# Altium schematic symbol library jlcpcb_2025_04_resistors_extended_2512.schlib: 2667 symbols (part 10 of 14)
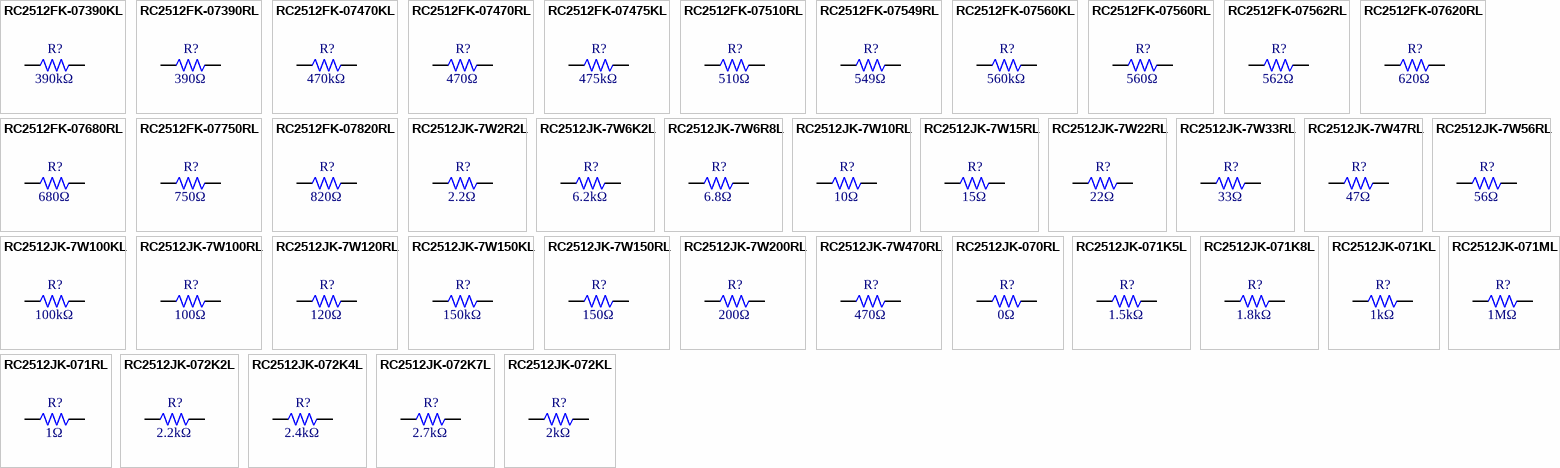
[diagram p75: symbols RC2512FK-07390KL to RC2512JK-072KL]

## RC2512JK-7W120RL
designator R?  Resistance: 120Ω  (hidden comment: *)
Resistor, 120Ω, ±5%, 2W, 200V, -55℃~+155℃, SMD 2512; Manufacturer: Uniroyal; Manufacturer Part Number: RC2512JK-7W120RL; Supplier 1: LCSC; Supplier Part Number 1: C2980091; JLCPCB Part Number: C2980091; Power Rating: 2W; Category: Resistors; Package Size: 2512; JLCPCB Basic Part: Yes; Tolerance: ±5%; Voltage Rating: 200V; Temperature Rating: -55℃~+155℃; ComponentLink1Description: Datasheet; ComponentLink1URL: https://wmsc.lcsc.com/wmsc/upload/file/pdf/v2/lcsc/2203031730_YAGEO-RC2512JK-7W120RL_C2980091.pdf; ComponentLink2Description: JLCPCB Part URL; ComponentLink2URL: https://jlcpcb.com/partdetail/C2980091
pins: 1, 2
1 alternate drawing of the same symbol

## RC2512JK-7W150KL
designator R?  Resistance: 150kΩ  (hidden comment: *)
Resistor, 150kΩ, ±5%, 2W, 200V, ±200ppm/℃, -55℃~+155℃, SMD 2512; Manufacturer: Uniroyal; Manufacturer Part Number: RC2512JK-7W150KL; Supplier 1: LCSC; Supplier Part Number 1: C723724; JLCPCB Part Number: C723724; Power Rating: 2W; Category: Resistors; Package Size: 2512; JLCPCB Basic Part: Yes; Tolerance: ±5%; Voltage Rating: 200V; Temperature Coefficient: ±200ppm/℃; Temperature Rating: -55℃~+155℃; ComponentLink1Description: Datasheet; ComponentLink1URL: https://wmsc.lcsc.com/wmsc/upload/file/pdf/v2/lcsc/2008171337_YAGEO-RC2512JK-7W150KL_C723724.pdf; ComponentLink2Description: JLCPCB Part URL; ComponentLink2URL: https://jlcpcb.com/partdetail/C723724
pins: 1, 2
1 alternate drawing of the same symbol

## RC2512JK-7W150RL
designator R?  Resistance: 150Ω  (hidden comment: *)
Resistor, 150Ω, ±5%, 2W, 200V, ±200ppm/℃, -55℃~+155℃, SMD 2512; Manufacturer: Uniroyal; Manufacturer Part Number: RC2512JK-7W150RL; Supplier 1: LCSC; Supplier Part Number 1: C876266; JLCPCB Part Number: C876266; Power Rating: 2W; Category: Resistors; Package Size: 2512; JLCPCB Basic Part: Yes; Tolerance: ±5%; Voltage Rating: 200V; Temperature Coefficient: ±200ppm/℃; Temperature Rating: -55℃~+155℃; ComponentLink1Description: Datasheet; ComponentLink1URL: https://wmsc.lcsc.com/wmsc/upload/file/pdf/v2/lcsc/2112131830_YAGEO-RC2512JK-7W150RL_C876266.pdf; ComponentLink2Description: JLCPCB Part URL; ComponentLink2URL: https://jlcpcb.com/partdetail/C876266
pins: 1, 2
1 alternate drawing of the same symbol

## RC2512JK-7W200RL
designator R?  Resistance: 200Ω  (hidden comment: *)
Resistor, 200Ω, ±5%, 2W, ±200ppm/℃, -55℃~+155℃, SMD 2512; Manufacturer: Uniroyal; Manufacturer Part Number: RC2512JK-7W200RL; Supplier 1: LCSC; Supplier Part Number 1: C5441843; JLCPCB Part Number: C5441843; Power Rating: 2W; Category: Resistors; Package Size: 2512; JLCPCB Basic Part: Yes; Tolerance: ±5%; Temperature Coefficient: ±200ppm/℃; Temperature Rating: -55℃~+155℃; ComponentLink1Description: Datasheet; ComponentLink1URL: https://wmsc.lcsc.com/wmsc/upload/file/pdf/v2/lcsc/2304071000_YAGEO-RC2512JK-7W200RL_C5441843.pdf; ComponentLink2Description: JLCPCB Part URL; ComponentLink2URL: https://jlcpcb.com/partdetail/C5441843
pins: 1, 2
1 alternate drawing of the same symbol

## RC2512JK-7W470RL
designator R?  Resistance: 470Ω  (hidden comment: *)
Resistor, 470Ω, ±5%, 2W, 200V, ±200ppm/℃, -55℃~+155℃, SMD 2512; Manufacturer: Uniroyal; Manufacturer Part Number: RC2512JK-7W470RL; Supplier 1: LCSC; Supplier Part Number 1: C136993; JLCPCB Part Number: C136993; Power Rating: 2W; Category: Resistors; Package Size: 2512; JLCPCB Basic Part: Yes; Tolerance: ±5%; Voltage Rating: 200V; Temperature Coefficient: ±200ppm/℃; Temperature Rating: -55℃~+155℃; ComponentLink1Description: Datasheet; ComponentLink1URL: https://wmsc.lcsc.com/wmsc/upload/file/pdf/v2/lcsc/2304140030_YAGEO-RC2512JK-7W470RL_C136993.pdf; ComponentLink2Description: JLCPCB Part URL; ComponentLink2URL: https://jlcpcb.com/partdetail/C136993
pins: 1, 2
1 alternate drawing of the same symbol

## RC2512JK-070RL
designator R?  Resistance: 0Ω  (hidden comment: *)
Resistor, 0Ω, 1W, 200V, -55℃~+155℃, SMD 2512; Manufacturer: Uniroyal; Manufacturer Part Number: RC2512JK-070RL; Supplier 1: LCSC; Supplier Part Number 1: C189505; JLCPCB Part Number: C189505; Power Rating: 1W; Category: Resistors; Package Size: 2512; JLCPCB Basic Part: Yes; Voltage Rating: 200V; Temperature Rating: -55℃~+155℃; ComponentLink1Description: Datasheet; ComponentLink1URL: https://wmsc.lcsc.com/wmsc/upload/file/pdf/v2/lcsc/2304140030_YAGEO-RC2512JK-070RL_C189505.pdf; ComponentLink2Description: JLCPCB Part URL; ComponentLink2URL: https://jlcpcb.com/partdetail/C189505
pins: 1, 2
1 alternate drawing of the same symbol

## RC2512JK-071K5L
designator R?  Resistance: 1.5kΩ  (hidden comment: *)
Resistor, 1.5kΩ, ±5%, 1W, 200V, ±100ppm/℃, -55℃~+155℃, SMD 2512; Manufacturer: Uniroyal; Manufacturer Part Number: RC2512JK-071K5L; Supplier 1: LCSC; Supplier Part Number 1: C309611; JLCPCB Part Number: C309611; Power Rating: 1W; Category: Resistors; Package Size: 2512; JLCPCB Basic Part: Yes; Tolerance: ±5%; Voltage Rating: 200V; Temperature Coefficient: ±100ppm/℃; Temperature Rating: -55℃~+155℃; ComponentLink1Description: Datasheet; ComponentLink1URL: https://wmsc.lcsc.com/wmsc/upload/file/pdf/v2/lcsc/2304140030_YAGEO-RC2512JK-071K5L_C309611.pdf; ComponentLink2Description: JLCPCB Part URL; ComponentLink2URL: https://jlcpcb.com/partdetail/C309611
pins: 1, 2
1 alternate drawing of the same symbol

## RC2512JK-071K8L
designator R?  Resistance: 1.8kΩ  (hidden comment: *)
Resistor, 1.8kΩ, ±5%, 1W, 200V, ±100ppm/℃, -55℃~+155℃, SMD 2512; Manufacturer: Uniroyal; Manufacturer Part Number: RC2512JK-071K8L; Supplier 1: LCSC; Supplier Part Number 1: C137011; JLCPCB Part Number: C137011; Power Rating: 1W; Category: Resistors; Package Size: 2512; JLCPCB Basic Part: Yes; Tolerance: ±5%; Voltage Rating: 200V; Temperature Coefficient: ±100ppm/℃; Temperature Rating: -55℃~+155℃; ComponentLink1Description: Datasheet; ComponentLink1URL: https://wmsc.lcsc.com/wmsc/upload/file/pdf/v2/lcsc/2304140030_YAGEO-RC2512JK-071K8L_C137011.pdf; ComponentLink2Description: JLCPCB Part URL; ComponentLink2URL: https://jlcpcb.com/partdetail/C137011
pins: 1, 2
1 alternate drawing of the same symbol

## RC2512JK-071KL
designator R?  Resistance: 1kΩ  (hidden comment: *)
Resistor, 1kΩ, ±5%, 1W, 200V, ±100ppm/℃, -55℃~+155℃, SMD 2512; Manufacturer: Uniroyal; Manufacturer Part Number: RC2512JK-071KL; Supplier 1: LCSC; Supplier Part Number 1: C137010; JLCPCB Part Number: C137010; Power Rating: 1W; Category: Resistors; Package Size: 2512; JLCPCB Basic Part: Yes; Tolerance: ±5%; Voltage Rating: 200V; Temperature Coefficient: ±100ppm/℃; Temperature Rating: -55℃~+155℃; ComponentLink1Description: Datasheet; ComponentLink1URL: https://wmsc.lcsc.com/wmsc/upload/file/pdf/v2/lcsc/2304140030_YAGEO-RC2512JK-071KL_C137010.pdf; ComponentLink2Description: JLCPCB Part URL; ComponentLink2URL: https://jlcpcb.com/partdetail/C137010
pins: 1, 2
1 alternate drawing of the same symbol

## RC2512JK-071ML
designator R?  Resistance: 1MΩ  (hidden comment: *)
Resistor, 1MΩ, ±5%, 1W, 200V, ±100ppm/℃, -55℃~+155℃, SMD 2512; Manufacturer: Uniroyal; Manufacturer Part Number: RC2512JK-071ML; Supplier 1: LCSC; Supplier Part Number 1: C723725; JLCPCB Part Number: C723725; Power Rating: 1W; Category: Resistors; Package Size: 2512; JLCPCB Basic Part: Yes; Tolerance: ±5%; Voltage Rating: 200V; Temperature Coefficient: ±100ppm/℃; Temperature Rating: -55℃~+155℃; ComponentLink1Description: Datasheet; ComponentLink1URL: https://wmsc.lcsc.com/wmsc/upload/file/pdf/v2/lcsc/2008201237_YAGEO-RC2512JK-071ML_C723725.pdf; ComponentLink2Description: JLCPCB Part URL; ComponentLink2URL: https://jlcpcb.com/partdetail/C723725
pins: 1, 2
1 alternate drawing of the same symbol

## RC2512JK-071RL
designator R?  Resistance: 1Ω  (hidden comment: *)
Resistor, 1Ω, ±5%, 1W, 200V, ±200ppm/℃, -55℃~+155℃, SMD 2512; Manufacturer: Uniroyal; Manufacturer Part Number: RC2512JK-071RL; Supplier 1: LCSC; Supplier Part Number 1: C914852; JLCPCB Part Number: C914852; Power Rating: 1W; Category: Resistors; Package Size: 2512; JLCPCB Basic Part: Yes; Tolerance: ±5%; Voltage Rating: 200V; Temperature Coefficient: ±200ppm/℃; Temperature Rating: -55℃~+155℃; ComponentLink1Description: Datasheet; ComponentLink1URL: https://wmsc.lcsc.com/wmsc/upload/file/pdf/v2/lcsc/2204291430_YAGEO-RC2512JK-071RL_C914852.pdf; ComponentLink2Description: JLCPCB Part URL; ComponentLink2URL: https://jlcpcb.com/partdetail/C914852
pins: 1, 2
1 alternate drawing of the same symbol

## RC2512JK-072K2L
designator R?  Resistance: 2.2kΩ  (hidden comment: *)
Resistor, 2.2kΩ, ±5%, 1W, 200V, ±100ppm/℃, -55℃~+155℃, SMD 2512; Manufacturer: Uniroyal; Manufacturer Part Number: RC2512JK-072K2L; Supplier 1: LCSC; Supplier Part Number 1: C309612; JLCPCB Part Number: C309612; Power Rating: 1W; Category: Resistors; Package Size: 2512; JLCPCB Basic Part: Yes; Tolerance: ±5%; Voltage Rating: 200V; Temperature Coefficient: ±100ppm/℃; Temperature Rating: -55℃~+155℃; ComponentLink1Description: Datasheet; ComponentLink1URL: https://wmsc.lcsc.com/wmsc/upload/file/pdf/v2/lcsc/2304140030_YAGEO-RC2512JK-072K2L_C309612.pdf; ComponentLink2Description: JLCPCB Part URL; ComponentLink2URL: https://jlcpcb.com/partdetail/C309612
pins: 1, 2
1 alternate drawing of the same symbol

## RC2512JK-072K4L
designator R?  Resistance: 2.4kΩ  (hidden comment: *)
Resistor, 2.4kΩ, ±5%, 1W, ±100ppm/℃, -55℃~+155℃, SMD 2512; Manufacturer: Uniroyal; Manufacturer Part Number: RC2512JK-072K4L; Supplier 1: LCSC; Supplier Part Number 1: C4030553; JLCPCB Part Number: C4030553; Power Rating: 1W; Category: Resistors; Package Size: 2512; JLCPCB Basic Part: Yes; Tolerance: ±5%; Temperature Coefficient: ±100ppm/℃; Temperature Rating: -55℃~+155℃; ComponentLink1Description: Datasheet; ComponentLink1URL: https://wmsc.lcsc.com/wmsc/upload/file/pdf/v2/lcsc/2311211102_YAGEO-RC2512JK-072K4L_C4030553.pdf; ComponentLink2Description: JLCPCB Part URL; ComponentLink2URL: https://jlcpcb.com/partdetail/C4030553
pins: 1, 2
1 alternate drawing of the same symbol

## RC2512JK-072K7L
designator R?  Resistance: 2.7kΩ  (hidden comment: *)
Resistor, 2.7kΩ, ±5%, 1W, 200V, ±100ppm/℃, -55℃~+155℃, SMD 2512; Manufacturer: Uniroyal; Manufacturer Part Number: RC2512JK-072K7L; Supplier 1: LCSC; Supplier Part Number 1: C326685; JLCPCB Part Number: C326685; Power Rating: 1W; Category: Resistors; Package Size: 2512; JLCPCB Basic Part: Yes; Tolerance: ±5%; Voltage Rating: 200V; Temperature Coefficient: ±100ppm/℃; Temperature Rating: -55℃~+155℃; ComponentLink1Description: Datasheet; ComponentLink1URL: https://wmsc.lcsc.com/wmsc/upload/file/pdf/v2/lcsc/1811141450_YAGEO-RC2512JK-072K7L_C326685.pdf; ComponentLink2Description: JLCPCB Part URL; ComponentLink2URL: https://jlcpcb.com/partdetail/C326685
pins: 1, 2
1 alternate drawing of the same symbol

## RC2512JK-072KL
designator R?  Resistance: 2kΩ  (hidden comment: *)
Resistor, 2kΩ, ±5%, 1W, 200V, ±100ppm/℃, -55℃~+155℃, SMD 2512; Manufacturer: Uniroyal; Manufacturer Part Number: RC2512JK-072KL; Supplier 1: LCSC; Supplier Part Number 1: C326688; JLCPCB Part Number: C326688; Power Rating: 1W; Category: Resistors; Package Size: 2512; JLCPCB Basic Part: Yes; Tolerance: ±5%; Voltage Rating: 200V; Temperature Coefficient: ±100ppm/℃; Temperature Rating: -55℃~+155℃; ComponentLink1Description: Datasheet; ComponentLink1URL: https://wmsc.lcsc.com/wmsc/upload/file/pdf/v2/lcsc/1811141444_YAGEO-RC2512JK-072KL_C326688.pdf; ComponentLink2Description: JLCPCB Part URL; ComponentLink2URL: https://jlcpcb.com/partdetail/C326688
pins: 1, 2
1 alternate drawing of the same symbol

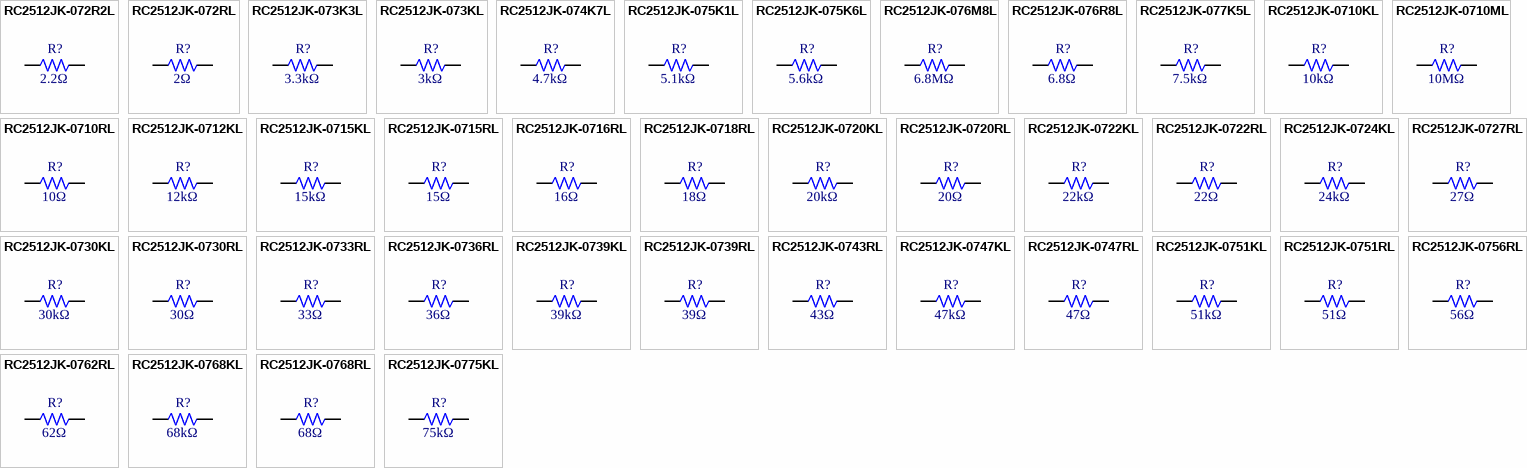
[diagram p45: symbols RC2512JK-072R2L to RC2512JK-0775KL]

## RC2512JK-072R2L
designator R?  Resistance: 2.2Ω  (hidden comment: *)
Resistor, 2.2Ω, ±5%, 1W, 200V, ±200ppm/℃, -55℃~+155℃, SMD 2512; Manufacturer: Uniroyal; Manufacturer Part Number: RC2512JK-072R2L; Supplier 1: LCSC; Supplier Part Number 1: C163332; JLCPCB Part Number: C163332; Power Rating: 1W; Category: Resistors; Package Size: 2512; JLCPCB Basic Part: Yes; Tolerance: ±5%; Voltage Rating: 200V; Temperature Coefficient: ±200ppm/℃; Temperature Rating: -55℃~+155℃; ComponentLink1Description: Datasheet; ComponentLink1URL: https://wmsc.lcsc.com/wmsc/upload/file/pdf/v2/lcsc/2304140030_YAGEO-RC2512JK-072R2L_C163332.pdf; ComponentLink2Description: JLCPCB Part URL; ComponentLink2URL: https://jlcpcb.com/partdetail/C163332
pins: 1, 2
1 alternate drawing of the same symbol

## RC2512JK-072RL
designator R?  Resistance: 2Ω  (hidden comment: *)
Resistor, 2Ω, ±5%, 1W, 200V, ±200ppm/℃, -55℃~+155℃, SMD 2512; Manufacturer: Uniroyal; Manufacturer Part Number: RC2512JK-072RL; Supplier 1: LCSC; Supplier Part Number 1: C137004; JLCPCB Part Number: C137004; Power Rating: 1W; Category: Resistors; Package Size: 2512; JLCPCB Basic Part: Yes; Tolerance: ±5%; Voltage Rating: 200V; Temperature Coefficient: ±200ppm/℃; Temperature Rating: -55℃~+155℃; ComponentLink1Description: Datasheet; ComponentLink1URL: https://wmsc.lcsc.com/wmsc/upload/file/pdf/v2/lcsc/2304140030_YAGEO-RC2512JK-072RL_C137004.pdf; ComponentLink2Description: JLCPCB Part URL; ComponentLink2URL: https://jlcpcb.com/partdetail/C137004
pins: 1, 2
1 alternate drawing of the same symbol

## RC2512JK-073K3L
designator R?  Resistance: 3.3kΩ  (hidden comment: *)
Resistor, 3.3kΩ, ±5%, 1W, 200V, ±100ppm/℃, -55℃~+155℃, SMD 2512; Manufacturer: Uniroyal; Manufacturer Part Number: RC2512JK-073K3L; Supplier 1: LCSC; Supplier Part Number 1: C137001; JLCPCB Part Number: C137001; Power Rating: 1W; Category: Resistors; Package Size: 2512; JLCPCB Basic Part: Yes; Tolerance: ±5%; Voltage Rating: 200V; Temperature Coefficient: ±100ppm/℃; Temperature Rating: -55℃~+155℃; ComponentLink1Description: Datasheet; ComponentLink1URL: https://wmsc.lcsc.com/wmsc/upload/file/pdf/v2/lcsc/2304140030_YAGEO-RC2512JK-073K3L_C137001.pdf; ComponentLink2Description: JLCPCB Part URL; ComponentLink2URL: https://jlcpcb.com/partdetail/C137001
pins: 1, 2
1 alternate drawing of the same symbol

## RC2512JK-073KL
designator R?  Resistance: 3kΩ  (hidden comment: *)
Resistor, 3kΩ, ±5%, 1W, 200V, ±100ppm/℃, -55℃~+155℃, SMD 2512; Manufacturer: Uniroyal; Manufacturer Part Number: RC2512JK-073KL; Supplier 1: LCSC; Supplier Part Number 1: C185255; JLCPCB Part Number: C185255; Power Rating: 1W; Category: Resistors; Package Size: 2512; JLCPCB Basic Part: Yes; Tolerance: ±5%; Voltage Rating: 200V; Temperature Coefficient: ±100ppm/℃; Temperature Rating: -55℃~+155℃; ComponentLink1Description: Datasheet; ComponentLink1URL: https://wmsc.lcsc.com/wmsc/upload/file/pdf/v2/lcsc/1912111437_YAGEO-RC2512JK-073KL_C185255.pdf; ComponentLink2Description: JLCPCB Part URL; ComponentLink2URL: https://jlcpcb.com/partdetail/C185255
pins: 1, 2
1 alternate drawing of the same symbol

## RC2512JK-074K7L
designator R?  Resistance: 4.7kΩ  (hidden comment: *)
Resistor, 4.7kΩ, ±5%, 1W, ±100ppm/℃, -55℃~+155℃, SMD 2512; Manufacturer: Uniroyal; Manufacturer Part Number: RC2512JK-074K7L; Supplier 1: LCSC; Supplier Part Number 1: C878291; JLCPCB Part Number: C878291; Power Rating: 1W; Category: Resistors; Package Size: 2512; JLCPCB Basic Part: Yes; Tolerance: ±5%; Temperature Coefficient: ±100ppm/℃; Temperature Rating: -55℃~+155℃; ComponentLink1Description: Datasheet; ComponentLink1URL: https://wmsc.lcsc.com/wmsc/upload/file/pdf/v2/lcsc/2205121145_YAGEO-RC2512JK-074K7L_C878291.pdf; ComponentLink2Description: JLCPCB Part URL; ComponentLink2URL: https://jlcpcb.com/partdetail/C878291
pins: 1, 2
1 alternate drawing of the same symbol

## RC2512JK-075K1L
designator R?  Resistance: 5.1kΩ  (hidden comment: *)
Resistor, 5.1kΩ, ±5%, 1W, ±100ppm/℃, -55℃~+155℃, SMD 2512; Manufacturer: Uniroyal; Manufacturer Part Number: RC2512JK-075K1L; Supplier 1: LCSC; Supplier Part Number 1: C724018; JLCPCB Part Number: C724018; Power Rating: 1W; Category: Resistors; Package Size: 2512; JLCPCB Basic Part: Yes; Tolerance: ±5%; Temperature Coefficient: ±100ppm/℃; Temperature Rating: -55℃~+155℃; ComponentLink1Description: Datasheet; ComponentLink1URL: https://wmsc.lcsc.com/wmsc/upload/file/pdf/v2/lcsc/2009261810_YAGEO-RC2512JK-075K1L_C724018.pdf; ComponentLink2Description: JLCPCB Part URL; ComponentLink2URL: https://jlcpcb.com/partdetail/C724018
pins: 1, 2
1 alternate drawing of the same symbol

## RC2512JK-075K6L
designator R?  Resistance: 5.6kΩ  (hidden comment: *)
Resistor, 5.6kΩ, ±5%, 1W, 200V, ±100ppm/℃, -55℃~+155℃, SMD 2512; Manufacturer: Uniroyal; Manufacturer Part Number: RC2512JK-075K6L; Supplier 1: LCSC; Supplier Part Number 1: C878298; JLCPCB Part Number: C878298; Power Rating: 1W; Category: Resistors; Package Size: 2512; JLCPCB Basic Part: Yes; Tolerance: ±5%; Voltage Rating: 200V; Temperature Coefficient: ±100ppm/℃; Temperature Rating: -55℃~+155℃; ComponentLink1Description: Datasheet; ComponentLink1URL: https://wmsc.lcsc.com/wmsc/upload/file/pdf/v2/lcsc/2111191730_YAGEO-RC2512JK-075K6L_C878298.pdf; ComponentLink2Description: JLCPCB Part URL; ComponentLink2URL: https://jlcpcb.com/partdetail/C878298
pins: 1, 2
1 alternate drawing of the same symbol

## RC2512JK-076M8L
designator R?  Resistance: 6.8MΩ  (hidden comment: *)
Resistor, 6.8MΩ, ±5%, 1W, 200V, ±100ppm/℃, -55℃~+155℃, SMD 2512; Manufacturer: Uniroyal; Manufacturer Part Number: RC2512JK-076M8L; Supplier 1: LCSC; Supplier Part Number 1: C326687; JLCPCB Part Number: C326687; Power Rating: 1W; Category: Resistors; Package Size: 2512; JLCPCB Basic Part: Yes; Tolerance: ±5%; Voltage Rating: 200V; Temperature Coefficient: ±100ppm/℃; Temperature Rating: -55℃~+155℃; ComponentLink1Description: Datasheet; ComponentLink1URL: https://wmsc.lcsc.com/wmsc/upload/file/pdf/v2/lcsc/1811141444_YAGEO-RC2512JK-076M8L_C326687.pdf; ComponentLink2Description: JLCPCB Part URL; ComponentLink2URL: https://jlcpcb.com/partdetail/C326687
pins: 1, 2
1 alternate drawing of the same symbol

## RC2512JK-076R8L
designator R?  Resistance: 6.8Ω  (hidden comment: *)
Resistor, 6.8Ω, ±5%, 1W, 200V, ±200ppm/℃, -55℃~+155℃, SMD 2512; Manufacturer: Uniroyal; Manufacturer Part Number: RC2512JK-076R8L; Supplier 1: LCSC; Supplier Part Number 1: C326575; JLCPCB Part Number: C326575; Power Rating: 1W; Category: Resistors; Package Size: 2512; JLCPCB Basic Part: Yes; Tolerance: ±5%; Voltage Rating: 200V; Temperature Coefficient: ±200ppm/℃; Temperature Rating: -55℃~+155℃; ComponentLink1Description: Datasheet; ComponentLink1URL: https://wmsc.lcsc.com/wmsc/upload/file/pdf/v2/lcsc/1811141450_YAGEO-RC2512JK-076R8L_C326575.pdf; ComponentLink2Description: JLCPCB Part URL; ComponentLink2URL: https://jlcpcb.com/partdetail/C326575
pins: 1, 2
1 alternate drawing of the same symbol

## RC2512JK-077K5L
designator R?  Resistance: 7.5kΩ  (hidden comment: *)
Resistor, 7.5kΩ, ±5%, 1W, 200V, ±100ppm/℃, -55℃~+155℃, SMD 2512; Manufacturer: Uniroyal; Manufacturer Part Number: RC2512JK-077K5L; Supplier 1: LCSC; Supplier Part Number 1: C136994; JLCPCB Part Number: C136994; Power Rating: 1W; Category: Resistors; Package Size: 2512; JLCPCB Basic Part: Yes; Tolerance: ±5%; Voltage Rating: 200V; Temperature Coefficient: ±100ppm/℃; Temperature Rating: -55℃~+155℃; ComponentLink1Description: Datasheet; ComponentLink1URL: https://wmsc.lcsc.com/wmsc/upload/file/pdf/v2/lcsc/2304140030_YAGEO-RC2512JK-077K5L_C136994.pdf; ComponentLink2Description: JLCPCB Part URL; ComponentLink2URL: https://jlcpcb.com/partdetail/C136994
pins: 1, 2
1 alternate drawing of the same symbol

## RC2512JK-0710KL
designator R?  Resistance: 10kΩ  (hidden comment: *)
Resistor, 10kΩ, ±5%, 1W, 200V, ±100ppm/℃, -55℃~+155℃, SMD 2512; Manufacturer: Uniroyal; Manufacturer Part Number: RC2512JK-0710KL; Supplier 1: LCSC; Supplier Part Number 1: C137016; JLCPCB Part Number: C137016; Power Rating: 1W; Category: Resistors; Package Size: 2512; JLCPCB Basic Part: Yes; Tolerance: ±5%; Voltage Rating: 200V; Temperature Coefficient: ±100ppm/℃; Temperature Rating: -55℃~+155℃; ComponentLink1Description: Datasheet; ComponentLink1URL: https://wmsc.lcsc.com/wmsc/upload/file/pdf/v2/lcsc/2304140030_YAGEO-RC2512JK-0710KL_C137016.pdf; ComponentLink2Description: JLCPCB Part URL; ComponentLink2URL: https://jlcpcb.com/partdetail/C137016
pins: 1, 2
1 alternate drawing of the same symbol

## RC2512JK-0710ML
designator R?  Resistance: 10MΩ  (hidden comment: *)
Resistor, 10MΩ, ±5%, 1W, 200V, ±100ppm/℃, -55℃~+155℃, SMD 2512; Manufacturer: Uniroyal; Manufacturer Part Number: RC2512JK-0710ML; Supplier 1: LCSC; Supplier Part Number 1: C137015; JLCPCB Part Number: C137015; Power Rating: 1W; Category: Resistors; Package Size: 2512; JLCPCB Basic Part: Yes; Tolerance: ±5%; Voltage Rating: 200V; Temperature Coefficient: ±100ppm/℃; Temperature Rating: -55℃~+155℃; ComponentLink1Description: Datasheet; ComponentLink1URL: https://wmsc.lcsc.com/wmsc/upload/file/pdf/v2/lcsc/2304140030_YAGEO-RC2512JK-0710ML_C137015.pdf; ComponentLink2Description: JLCPCB Part URL; ComponentLink2URL: https://jlcpcb.com/partdetail/C137015
pins: 1, 2
1 alternate drawing of the same symbol

## RC2512JK-0710RL
designator R?  Resistance: 10Ω  (hidden comment: *)
Resistor, 10Ω, ±5%, 1W, 200V, ±200ppm/℃, -55℃~+155℃, SMD 2512; Manufacturer: Uniroyal; Manufacturer Part Number: RC2512JK-0710RL; Supplier 1: LCSC; Supplier Part Number 1: C137014; JLCPCB Part Number: C137014; Power Rating: 1W; Category: Resistors; Package Size: 2512; JLCPCB Basic Part: Yes; Tolerance: ±5%; Voltage Rating: 200V; Temperature Coefficient: ±200ppm/℃; Temperature Rating: -55℃~+155℃; ComponentLink1Description: Datasheet; ComponentLink1URL: https://wmsc.lcsc.com/wmsc/upload/file/pdf/v2/lcsc/2304140030_YAGEO-RC2512JK-0710RL_C137014.pdf; ComponentLink2Description: JLCPCB Part URL; ComponentLink2URL: https://jlcpcb.com/partdetail/C137014
pins: 1, 2
1 alternate drawing of the same symbol

## RC2512JK-0712KL
designator R?  Resistance: 12kΩ  (hidden comment: *)
Resistor, 12kΩ, ±5%, 1W, 200V, ±100ppm/℃, -55℃~+155℃, SMD 2512; Manufacturer: Uniroyal; Manufacturer Part Number: RC2512JK-0712KL; Supplier 1: LCSC; Supplier Part Number 1: C724017; JLCPCB Part Number: C724017; Power Rating: 1W; Category: Resistors; Package Size: 2512; JLCPCB Basic Part: Yes; Tolerance: ±5%; Voltage Rating: 200V; Temperature Coefficient: ±100ppm/℃; Temperature Rating: -55℃~+155℃; ComponentLink1Description: Datasheet; ComponentLink1URL: https://wmsc.lcsc.com/wmsc/upload/file/pdf/v2/lcsc/2009261810_YAGEO-RC2512JK-0712KL_C724017.pdf; ComponentLink2Description: JLCPCB Part URL; ComponentLink2URL: https://jlcpcb.com/partdetail/C724017
pins: 1, 2
1 alternate drawing of the same symbol

## RC2512JK-0715KL
designator R?  Resistance: 15kΩ  (hidden comment: *)
Resistor, 15kΩ, ±5%, 1W, 200V, ±100ppm/℃, -55℃~+155℃, SMD 2512; Manufacturer: Uniroyal; Manufacturer Part Number: RC2512JK-0715KL; Supplier 1: LCSC; Supplier Part Number 1: C1882622; JLCPCB Part Number: C1882622; Power Rating: 1W; Category: Resistors; Package Size: 2512; JLCPCB Basic Part: Yes; Tolerance: ±5%; Voltage Rating: 200V; Temperature Coefficient: ±100ppm/℃; Temperature Rating: -55℃~+155℃; ComponentLink1Description: Datasheet; ComponentLink1URL: https://wmsc.lcsc.com/wmsc/upload/file/pdf/v2/lcsc/2201280400_YAGEO-RC2512JK-0715KL_C1882622.pdf; ComponentLink2Description: JLCPCB Part URL; ComponentLink2URL: https://jlcpcb.com/partdetail/C1882622
pins: 1, 2
1 alternate drawing of the same symbol

## RC2512JK-0715RL
designator R?  Resistance: 15Ω  (hidden comment: *)
Resistor, 15Ω, ±5%, 1W, 200V, ±100ppm/℃, -55℃~+155℃, SMD 2512; Manufacturer: Uniroyal; Manufacturer Part Number: RC2512JK-0715RL; Supplier 1: LCSC; Supplier Part Number 1: C326693; JLCPCB Part Number: C326693; Power Rating: 1W; Category: Resistors; Package Size: 2512; JLCPCB Basic Part: Yes; Tolerance: ±5%; Voltage Rating: 200V; Temperature Coefficient: ±100ppm/℃; Temperature Rating: -55℃~+155℃; ComponentLink1Description: Datasheet; ComponentLink1URL: https://wmsc.lcsc.com/wmsc/upload/file/pdf/v2/lcsc/1811141450_YAGEO-RC2512JK-0715RL_C326693.pdf; ComponentLink2Description: JLCPCB Part URL; ComponentLink2URL: https://jlcpcb.com/partdetail/C326693
pins: 1, 2
1 alternate drawing of the same symbol

## RC2512JK-0716RL
designator R?  Resistance: 16Ω  (hidden comment: *)
Resistor, 16Ω, ±5%, 1W, 200V, ±100ppm/℃, -55℃~+155℃, SMD 2512; Manufacturer: Uniroyal; Manufacturer Part Number: RC2512JK-0716RL; Supplier 1: LCSC; Supplier Part Number 1: C326692; JLCPCB Part Number: C326692; Power Rating: 1W; Category: Resistors; Package Size: 2512; JLCPCB Basic Part: Yes; Tolerance: ±5%; Voltage Rating: 200V; Temperature Coefficient: ±100ppm/℃; Temperature Rating: -55℃~+155℃; ComponentLink1Description: Datasheet; ComponentLink1URL: https://wmsc.lcsc.com/wmsc/upload/file/pdf/v2/lcsc/1811141241_YAGEO-RC2512JK-0716RL_C326692.pdf; ComponentLink2Description: JLCPCB Part URL; ComponentLink2URL: https://jlcpcb.com/partdetail/C326692
pins: 1, 2
1 alternate drawing of the same symbol

## RC2512JK-0718RL
designator R?  Resistance: 18Ω  (hidden comment: *)
Resistor, 18Ω, ±5%, 1W, 200V, ±100ppm/℃, -55℃~+155℃, SMD 2512; Manufacturer: Uniroyal; Manufacturer Part Number: RC2512JK-0718RL; Supplier 1: LCSC; Supplier Part Number 1: C326684; JLCPCB Part Number: C326684; Power Rating: 1W; Category: Resistors; Package Size: 2512; JLCPCB Basic Part: Yes; Tolerance: ±5%; Voltage Rating: 200V; Temperature Coefficient: ±100ppm/℃; Temperature Rating: -55℃~+155℃; ComponentLink1Description: Datasheet; ComponentLink1URL: https://wmsc.lcsc.com/wmsc/upload/file/pdf/v2/lcsc/1811141444_YAGEO-RC2512JK-0718RL_C326684.pdf; ComponentLink2Description: JLCPCB Part URL; ComponentLink2URL: https://jlcpcb.com/partdetail/C326684
pins: 1, 2
1 alternate drawing of the same symbol

## RC2512JK-0720KL
designator R?  Resistance: 20kΩ  (hidden comment: *)
Resistor, 20kΩ, ±5%, 1W, 200V, ±100ppm/℃, -55℃~+155℃, SMD 2512; Manufacturer: Uniroyal; Manufacturer Part Number: RC2512JK-0720KL; Supplier 1: LCSC; Supplier Part Number 1: C163333; JLCPCB Part Number: C163333; Power Rating: 1W; Category: Resistors; Package Size: 2512; JLCPCB Basic Part: Yes; Tolerance: ±5%; Voltage Rating: 200V; Temperature Coefficient: ±100ppm/℃; Temperature Rating: -55℃~+155℃; ComponentLink1Description: Datasheet; ComponentLink1URL: https://wmsc.lcsc.com/wmsc/upload/file/pdf/v2/lcsc/2304140030_YAGEO-RC2512JK-0720KL_C163333.pdf; ComponentLink2Description: JLCPCB Part URL; ComponentLink2URL: https://jlcpcb.com/partdetail/C163333
pins: 1, 2
1 alternate drawing of the same symbol

## RC2512JK-0720RL
designator R?  Resistance: 20Ω  (hidden comment: *)
Resistor, 20Ω, ±5%, 1W, 200V, ±100ppm/℃, -55℃~+155℃, SMD 2512; Manufacturer: Uniroyal; Manufacturer Part Number: RC2512JK-0720RL; Supplier 1: LCSC; Supplier Part Number 1: C137009; JLCPCB Part Number: C137009; Power Rating: 1W; Category: Resistors; Package Size: 2512; JLCPCB Basic Part: Yes; Tolerance: ±5%; Voltage Rating: 200V; Temperature Coefficient: ±100ppm/℃; Temperature Rating: -55℃~+155℃; ComponentLink1Description: Datasheet; ComponentLink1URL: https://wmsc.lcsc.com/wmsc/upload/file/pdf/v2/lcsc/2304140030_YAGEO-RC2512JK-0720RL_C137009.pdf; ComponentLink2Description: JLCPCB Part URL; ComponentLink2URL: https://jlcpcb.com/partdetail/C137009
pins: 1, 2
1 alternate drawing of the same symbol

## RC2512JK-0722KL
designator R?  Resistance: 22kΩ  (hidden comment: *)
Resistor, 22kΩ, ±5%, 1W, 200V, ±100ppm/℃, -55℃~+155℃, SMD 2512; Manufacturer: Uniroyal; Manufacturer Part Number: RC2512JK-0722KL; Supplier 1: LCSC; Supplier Part Number 1: C326690; JLCPCB Part Number: C326690; Power Rating: 1W; Category: Resistors; Package Size: 2512; JLCPCB Basic Part: Yes; Tolerance: ±5%; Voltage Rating: 200V; Temperature Coefficient: ±100ppm/℃; Temperature Rating: -55℃~+155℃; ComponentLink1Description: Datasheet; ComponentLink1URL: https://wmsc.lcsc.com/wmsc/upload/file/pdf/v2/lcsc/1811141444_YAGEO-RC2512JK-0722KL_C326690.pdf; ComponentLink2Description: JLCPCB Part URL; ComponentLink2URL: https://jlcpcb.com/partdetail/C326690
pins: 1, 2
1 alternate drawing of the same symbol

## RC2512JK-0722RL
designator R?  Resistance: 22Ω  (hidden comment: *)
Resistor, 22Ω, ±5%, 1W, 200V, ±100ppm/℃, -55℃~+155℃, SMD 2512; Manufacturer: Uniroyal; Manufacturer Part Number: RC2512JK-0722RL; Supplier 1: LCSC; Supplier Part Number 1: C137007; JLCPCB Part Number: C137007; Power Rating: 1W; Category: Resistors; Package Size: 2512; JLCPCB Basic Part: Yes; Tolerance: ±5%; Voltage Rating: 200V; Temperature Coefficient: ±100ppm/℃; Temperature Rating: -55℃~+155℃; ComponentLink1Description: Datasheet; ComponentLink1URL: https://wmsc.lcsc.com/wmsc/upload/file/pdf/v2/lcsc/2304140030_YAGEO-RC2512JK-0722RL_C137007.pdf; ComponentLink2Description: JLCPCB Part URL; ComponentLink2URL: https://jlcpcb.com/partdetail/C137007
pins: 1, 2
1 alternate drawing of the same symbol

## RC2512JK-0724KL
designator R?  Resistance: 24kΩ  (hidden comment: *)
Resistor, 24kΩ, ±5%, 1W, 200V, ±100ppm/℃, -55℃~+155℃, SMD 2512; Manufacturer: Uniroyal; Manufacturer Part Number: RC2512JK-0724KL; Supplier 1: LCSC; Supplier Part Number 1: C354982; JLCPCB Part Number: C354982; Power Rating: 1W; Category: Resistors; Package Size: 2512; JLCPCB Basic Part: Yes; Tolerance: ±5%; Voltage Rating: 200V; Temperature Coefficient: ±100ppm/℃; Temperature Rating: -55℃~+155℃; ComponentLink1Description: Datasheet; ComponentLink1URL: https://wmsc.lcsc.com/wmsc/upload/file/pdf/v2/lcsc/2008171232_YAGEO-RC2512JK-0724KL_C354982.pdf; ComponentLink2Description: JLCPCB Part URL; ComponentLink2URL: https://jlcpcb.com/partdetail/C354982
pins: 1, 2
1 alternate drawing of the same symbol

## RC2512JK-0727RL
designator R?  Resistance: 27Ω  (hidden comment: *)
Resistor, 27Ω, ±5%, 1W, 200V, ±100ppm/℃, -55℃~+155℃, SMD 2512; Manufacturer: Uniroyal; Manufacturer Part Number: RC2512JK-0727RL; Supplier 1: LCSC; Supplier Part Number 1: C1882619; JLCPCB Part Number: C1882619; Power Rating: 1W; Category: Resistors; Package Size: 2512; JLCPCB Basic Part: Yes; Tolerance: ±5%; Voltage Rating: 200V; Temperature Coefficient: ±100ppm/℃; Temperature Rating: -55℃~+155℃; ComponentLink1Description: Datasheet; ComponentLink1URL: https://wmsc.lcsc.com/wmsc/upload/file/pdf/v2/lcsc/2201280400_YAGEO-RC2512JK-0727RL_C1882619.pdf; ComponentLink2Description: JLCPCB Part URL; ComponentLink2URL: https://jlcpcb.com/partdetail/C1882619
pins: 1, 2
1 alternate drawing of the same symbol

## RC2512JK-0730KL
designator R?  Resistance: 30kΩ  (hidden comment: *)
Resistor, 30kΩ, ±5%, 1W, 200V, ±100ppm/℃, -55℃~+155℃, SMD 2512; Manufacturer: Uniroyal; Manufacturer Part Number: RC2512JK-0730KL; Supplier 1: LCSC; Supplier Part Number 1: C132747; JLCPCB Part Number: C132747; Power Rating: 1W; Category: Resistors; Package Size: 2512; JLCPCB Basic Part: Yes; Tolerance: ±5%; Voltage Rating: 200V; Temperature Coefficient: ±100ppm/℃; Temperature Rating: -55℃~+155℃; ComponentLink1Description: Datasheet; ComponentLink1URL: https://wmsc.lcsc.com/wmsc/upload/file/pdf/v2/lcsc/1810271821_YAGEO-RC2512JK-0730KL_C132747.pdf; ComponentLink2Description: JLCPCB Part URL; ComponentLink2URL: https://jlcpcb.com/partdetail/C132747
pins: 1, 2
1 alternate drawing of the same symbol

## RC2512JK-0730RL
designator R?  Resistance: 30Ω  (hidden comment: *)
Resistor, 30Ω, ±5%, 1W, 200V, ±100ppm/℃, -55℃~+155℃, SMD 2512; Manufacturer: Uniroyal; Manufacturer Part Number: RC2512JK-0730RL; Supplier 1: LCSC; Supplier Part Number 1: C309613; JLCPCB Part Number: C309613; Power Rating: 1W; Category: Resistors; Package Size: 2512; JLCPCB Basic Part: Yes; Tolerance: ±5%; Voltage Rating: 200V; Temperature Coefficient: ±100ppm/℃; Temperature Rating: -55℃~+155℃; ComponentLink1Description: Datasheet; ComponentLink1URL: https://wmsc.lcsc.com/wmsc/upload/file/pdf/v2/lcsc/2304140030_YAGEO-RC2512JK-0730RL_C309613.pdf; ComponentLink2Description: JLCPCB Part URL; ComponentLink2URL: https://jlcpcb.com/partdetail/C309613
pins: 1, 2
1 alternate drawing of the same symbol

## RC2512JK-0733RL
designator R?  Resistance: 33Ω  (hidden comment: *)
Resistor, 33Ω, ±5%, 1W, 200V, ±100ppm/℃, -55℃~+155℃, SMD 2512; Manufacturer: Uniroyal; Manufacturer Part Number: RC2512JK-0733RL; Supplier 1: LCSC; Supplier Part Number 1: C375687; JLCPCB Part Number: C375687; Power Rating: 1W; Category: Resistors; Package Size: 2512; JLCPCB Basic Part: Yes; Tolerance: ±5%; Voltage Rating: 200V; Temperature Coefficient: ±100ppm/℃; Temperature Rating: -55℃~+155℃; ComponentLink1Description: Datasheet; ComponentLink1URL: https://wmsc.lcsc.com/wmsc/upload/file/pdf/v2/lcsc/1912111437_YAGEO-RC2512JK-0733RL_C375687.pdf; ComponentLink2Description: JLCPCB Part URL; ComponentLink2URL: https://jlcpcb.com/partdetail/C375687
pins: 1, 2
1 alternate drawing of the same symbol

## RC2512JK-0736RL
designator R?  Resistance: 36Ω  (hidden comment: *)
Resistor, 36Ω, ±5%, 1W, 200V, ±100ppm/℃, -55℃~+155℃, SMD 2512; Manufacturer: Uniroyal; Manufacturer Part Number: RC2512JK-0736RL; Supplier 1: LCSC; Supplier Part Number 1: C2936607; JLCPCB Part Number: C2936607; Power Rating: 1W; Category: Resistors; Package Size: 2512; JLCPCB Basic Part: Yes; Tolerance: ±5%; Voltage Rating: 200V; Temperature Coefficient: ±100ppm/℃; Temperature Rating: -55℃~+155℃; ComponentLink1Description: Datasheet; ComponentLink1URL: https://wmsc.lcsc.com/wmsc/upload/file/pdf/v2/lcsc/2201121730_YAGEO-RC2512JK-0736RL_C2936607.pdf; ComponentLink2Description: JLCPCB Part URL; ComponentLink2URL: https://jlcpcb.com/partdetail/C2936607
pins: 1, 2
1 alternate drawing of the same symbol

## RC2512JK-0739KL
designator R?  Resistance: 39kΩ  (hidden comment: *)
Resistor, 39kΩ, ±5%, 1W, 200V, ±100ppm/℃, -55℃~+155℃, SMD 2512; Manufacturer: Uniroyal; Manufacturer Part Number: RC2512JK-0739KL; Supplier 1: LCSC; Supplier Part Number 1: C309616; JLCPCB Part Number: C309616; Power Rating: 1W; Category: Resistors; Package Size: 2512; JLCPCB Basic Part: Yes; Tolerance: ±5%; Voltage Rating: 200V; Temperature Coefficient: ±100ppm/℃; Temperature Rating: -55℃~+155℃; ComponentLink1Description: Datasheet; ComponentLink1URL: https://wmsc.lcsc.com/wmsc/upload/file/pdf/v2/lcsc/2304140030_YAGEO-RC2512JK-0739KL_C309616.pdf; ComponentLink2Description: JLCPCB Part URL; ComponentLink2URL: https://jlcpcb.com/partdetail/C309616
pins: 1, 2
1 alternate drawing of the same symbol

## RC2512JK-0739RL
designator R?  Resistance: 39Ω  (hidden comment: *)
Resistor, 39Ω, ±5%, 1W, 200V, ±100ppm/℃, -55℃~+155℃, SMD 2512; Manufacturer: Uniroyal; Manufacturer Part Number: RC2512JK-0739RL; Supplier 1: LCSC; Supplier Part Number 1: C1882618; JLCPCB Part Number: C1882618; Power Rating: 1W; Category: Resistors; Package Size: 2512; JLCPCB Basic Part: Yes; Tolerance: ±5%; Voltage Rating: 200V; Temperature Coefficient: ±100ppm/℃; Temperature Rating: -55℃~+155℃; ComponentLink1Description: Datasheet; ComponentLink1URL: https://wmsc.lcsc.com/wmsc/upload/file/pdf/v2/lcsc/2201280400_YAGEO-RC2512JK-0739RL_C1882618.pdf; ComponentLink2Description: JLCPCB Part URL; ComponentLink2URL: https://jlcpcb.com/partdetail/C1882618
pins: 1, 2
1 alternate drawing of the same symbol

## RC2512JK-0743RL
designator R?  Resistance: 43Ω  (hidden comment: *)
Resistor, 43Ω, ±5%, 1W, 200V, ±100ppm/℃, -55℃~+155℃, SMD 2512; Manufacturer: Uniroyal; Manufacturer Part Number: RC2512JK-0743RL; Supplier 1: LCSC; Supplier Part Number 1: C163331; JLCPCB Part Number: C163331; Power Rating: 1W; Category: Resistors; Package Size: 2512; JLCPCB Basic Part: Yes; Tolerance: ±5%; Voltage Rating: 200V; Temperature Coefficient: ±100ppm/℃; Temperature Rating: -55℃~+155℃; ComponentLink1Description: Datasheet; ComponentLink1URL: https://wmsc.lcsc.com/wmsc/upload/file/pdf/v2/lcsc/2304140030_YAGEO-RC2512JK-0743RL_C163331.pdf; ComponentLink2Description: JLCPCB Part URL; ComponentLink2URL: https://jlcpcb.com/partdetail/C163331
pins: 1, 2
1 alternate drawing of the same symbol
